# Altium footprint library BMS_Slave.PcbLib: 58 footprints (part 4 of 4)
Each footprint in its own frame and in the unit in brackets; x right, y up, seen from the top. Pads: shape width x height; smd on the part's side, far side on the other; paste and mask are expansions set on the pad; w line width, h text height; cw(c..) or ccw(c..) is an arc to the next point about the centre after c.
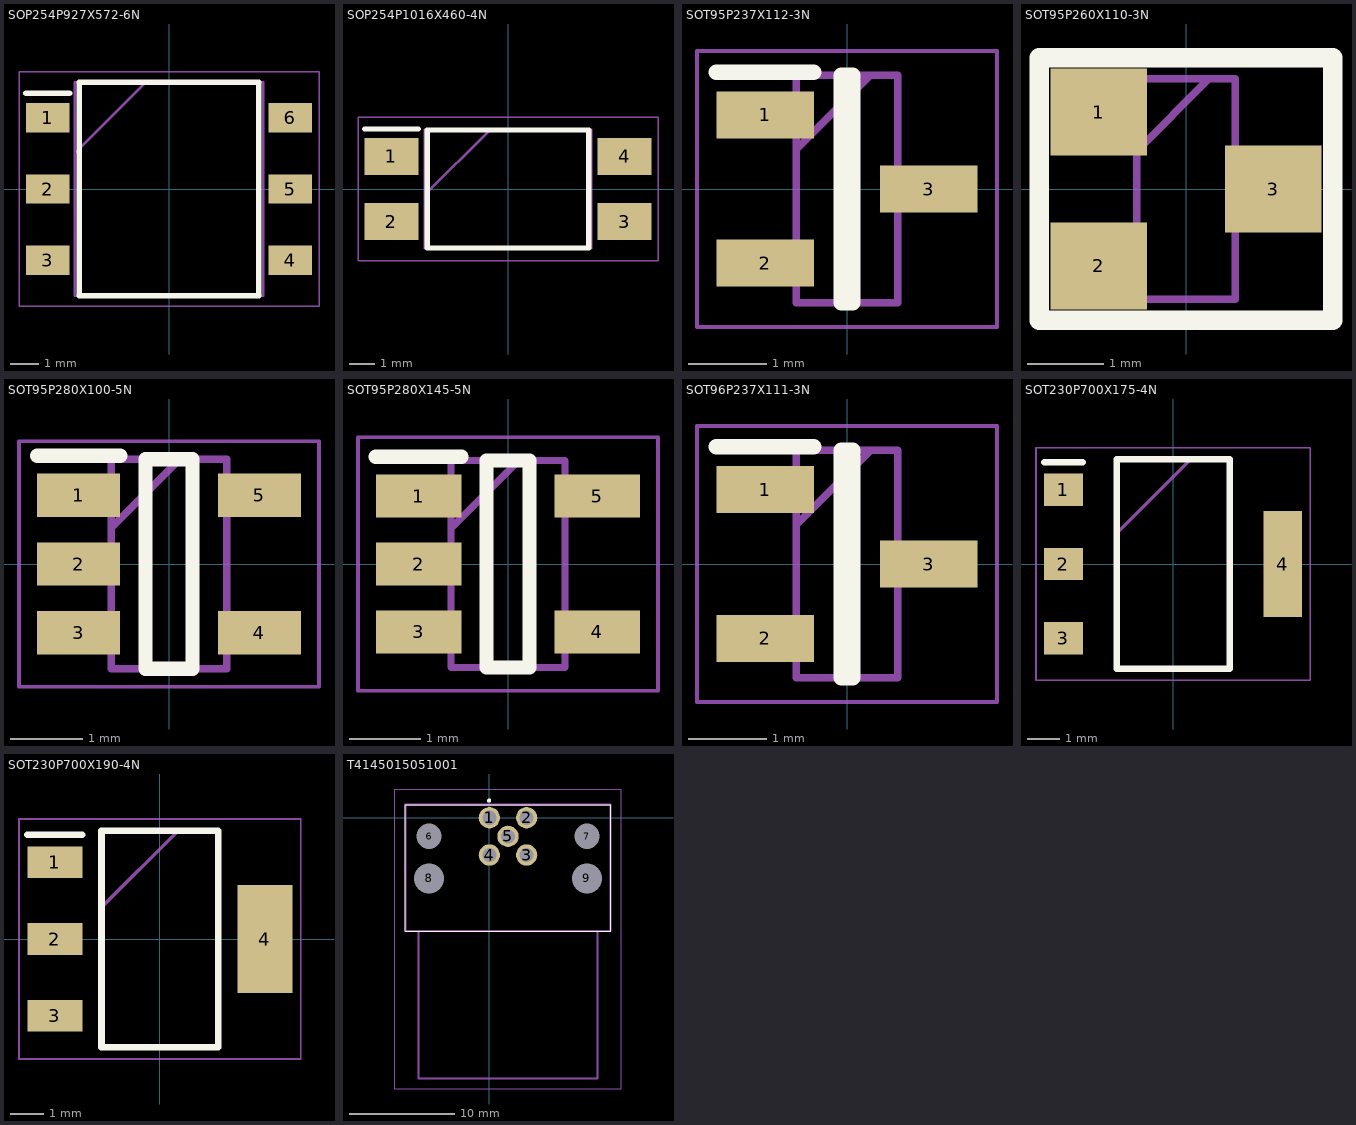
[diagram p3: the footprints below, top view; thin cyan lines are the x and y axes]

## SOP254P927X572-6N [mm]
pads (6):
  rect 1.55x1.05 smd: 1(-4.325,2.54) 2(-4.325,0) 3(-4.325,-2.54) 4(4.325,-2.54) 5(4.325,0) 6(4.325,2.54)
Top Overlay:
  lines w0.2: -5.1,3.415 -3.55,3.415 ; -3.2,-3.81 3.2,-3.81 3.2,3.81 -3.2,3.81 -3.2,-3.81
Mechanical 13:
  lines w0.1: -3.365,1.27 -0.825,3.81 ; -3.365,-3.81 3.365,-3.81 3.365,3.81 -3.365,3.81 -3.365,-3.81
Mechanical 15:
  lines w0.05: -5.35,-4.185 5.35,-4.185 5.35,4.185 -5.35,4.185 -5.35,-4.185
3D body "SM91502ALE.stp": height 5.72, standoff 0, extent -4.635,-3.81 4.635,3.81

## SOP254P1016X460-4N [mm]
pads (4):
  rect 2.1x1.45 smd: 1(-4.55,1.27) 2(-4.55,-1.27) 3(4.55,-1.27) 4(4.55,1.27)
Top Overlay:
  lines w0.2: -5.6,2.345 -3.5,2.345 ; -3.15,-2.3 3.15,-2.3 3.15,2.3 -3.15,2.3 -3.15,-2.3
Mechanical 13:
  lines w0.1: -3.25,-0.24 -0.71,2.3 ; -3.25,-2.3 3.25,-2.3 3.25,2.3 -3.25,2.3 -3.25,-2.3
Mechanical 15:
  lines w0.05: -5.85,-2.8 5.85,-2.8 5.85,2.8 -5.85,2.8 -5.85,-2.8
3D body "LTV-817S.stp": height 4.6, standoff 0, extent -5.08,-2.3 5.08,2.3

## SOT95P237X112-3N [mm]
pads (3):
  rect 1.25x0.6 smd: 1(-1.05,0.95) 2(-1.05,-0.95) 3(1.05,0)
Top Overlay:
  lines w0.2: -1.675,1.5 -0.425,1.5 ; -0.075,-1.46 0.075,-1.46 0.075,1.46 -0.075,1.46 -0.075,-1.46
Mechanical 13:
  lines w0.1: -0.65,0.51 0.3,1.46 ; -0.65,-1.46 0.65,-1.46 0.65,1.46 -0.65,1.46 -0.65,-1.46
Mechanical 15:
  lines w0.05: -1.925,-1.77 1.925,-1.77 1.925,1.77 -1.925,1.77 -1.925,-1.77
3D body "ATL431BQDBZR.stp": height 1.12, standoff 0, extent -1.185,-1.46 1.185,1.46

## SOT95P260X110-3N [mm]
pads (3):
  rect 1.27x1.143 smd: 1(-1.15,1.014) 2(-1.15,-1.014) 3(1.15,0)
Top Overlay:
  lines w0.254: -1.93,-1.727 -1.93,1.727 1.93,1.727 1.93,-1.727 -1.93,-1.727
Mechanical 13:
  lines w0.1: -0.65,0.5 0.3,1.45 ; -0.65,-1.45 -0.65,1.45 0.65,1.45 0.65,-1.45 -0.65,-1.45
Mechanical 15:
  lines w0.05: -1.975,-1.75 -1.975,1.75 1.975,1.75 1.975,-1.75 -1.975,-1.75
3D body "BSS308PE_H6327.stp": height 1.1, standoff 0, extent -1.3,-1.45 1.3,1.45

## SOT95P280X100-5N [mm]
pads (5):
  rect 1.15x0.6 smd: 1(-1.25,0.95) 2(-1.25,0) 3(-1.25,-0.95) 4(1.25,-0.95) 5(1.25,0.95)
Top Overlay:
  lines w0.2: -1.825,1.5 -0.675,1.5 ; -0.325,-1.45 -0.325,1.45 0.325,1.45 0.325,-1.45 -0.325,-1.45
Mechanical 13:
  lines w0.1: -0.8,0.5 0.15,1.45 ; -0.8,-1.45 -0.8,1.45 0.8,1.45 0.8,-1.45 -0.8,-1.45
Mechanical 15:
  lines w0.05: -2.075,-1.7 -2.075,1.7 2.075,1.7 2.075,-1.7 -2.075,-1.7
3D body "ADP160AUJZ-3.3-R7.stp": height 1, standoff 0, extent -1.4,-1.45 1.4,1.45

## SOT95P280X145-5N [mm]
pads (5):
  rect 1.2x0.6 smd: 1(-1.25,0.95) 2(-1.25,0) 3(-1.25,-0.95) 4(1.25,-0.95) 5(1.25,0.95)
Top Overlay:
  lines w0.2: -1.85,1.5 -0.65,1.5 ; -0.3,-1.45 0.3,-1.45 0.3,1.45 -0.3,1.45 -0.3,-1.45
Mechanical 13:
  lines w0.1: -0.8,0.5 0.15,1.45 ; -0.8,-1.45 0.8,-1.45 0.8,1.45 -0.8,1.45 -0.8,-1.45
Mechanical 15:
  lines w0.05: -2.1,-1.775 2.1,-1.775 2.1,1.775 -2.1,1.775 -2.1,-1.775
3D body "TLV1701QDBVRQ1.stp": height 1.45, standoff 0, extent -1.4,-1.45 1.4,1.45

## SOT96P237X111-3N [mm]
pads (3):
  rect 1.25x0.6 smd: 1(-1.05,0.955) 2(-1.05,-0.955) 3(1.05,0)
Top Overlay:
  lines w0.2: -1.675,1.505 -0.425,1.505 ; -0.075,-1.46 0.075,-1.46 0.075,1.46 -0.075,1.46 -0.075,-1.46
Mechanical 13:
  lines w0.1: -0.65,0.505 0.305,1.46 ; -0.65,-1.46 0.65,-1.46 0.65,1.46 -0.65,1.46 -0.65,-1.46
Mechanical 15:
  lines w0.05: -1.925,-1.77 1.925,-1.77 1.925,1.77 -1.925,1.77 -1.925,-1.77
3D body "SZNUP3105LT1G.stp": height 1.11, standoff 0, extent -1.185,-1.46 1.185,1.46

## SOT230P700X175-4N [mm]
pads (4):
  rect 1.2x1 smd: 1(-3.4,2.3) 2(-3.4,0) 3(-3.4,-2.3)
  rect 1.2x3.3 smd: 4(3.4,0)
Top Overlay:
  lines w0.2: -4,3.15 -2.8,3.15 ; -1.75,-3.25 -1.75,3.25 1.75,3.25 1.75,-3.25 -1.75,-3.25
Mechanical 13:
  lines w0.1: -1.75,0.95 0.55,3.25 ; -1.75,-3.25 -1.75,3.25 1.75,3.25 1.75,-3.25 -1.75,-3.25
Mechanical 15:
  lines w0.05: -4.25,-3.6 -4.25,3.6 4.25,3.6 4.25,-3.6 -4.25,-3.6
3D body "NSV1C201MZ4T1G.stp": height 1.75, standoff 0, extent -3.5,-3.25 3.5,3.25

## SOT230P700X190-4N [mm]
pads (4):
  rect 1.65x0.95 smd: 1(-3.15,2.3) 2(-3.15,0) 3(-3.15,-2.3)
  rect 1.65x3.25 smd: 4(3.15,0)
Top Overlay:
  lines w0.2: -3.975,3.125 -2.325,3.125 ; -1.75,-3.25 1.75,-3.25 1.75,3.25 -1.75,3.25 -1.75,-3.25
Mechanical 13:
  lines w0.1: -1.75,0.95 0.55,3.25 ; -1.75,-3.25 1.75,-3.25 1.75,3.25 -1.75,3.25 -1.75,-3.25
Mechanical 15:
  lines w0.05: -4.225,-3.6 4.225,-3.6 4.225,3.6 -4.225,3.6 -4.225,-3.6
3D body "LD1117S50TR.stp": height 1.9, standoff 0, extent -3.5,-3.25 3.5,3.25

## T4145015051001 [mm]
pads (9):
  round 2.025 hole 1.35: 1(0,0) 2(3.54,0) 3(3.54,-3.54) 4(0,-3.54) 5(1.77,-1.77)
  round 1.2 hole 2.4 unplated: 6(-5.73,-1.77) 7(9.27,-1.77)
  round 1.425 hole 2.85 unplated: 8(-5.73,-5.77) 9(9.27,-5.77)
Top Overlay:
  lines w0.1: -7.98,-10.77 -7.98,1.23 11.52,1.23 11.52,-10.77 -7.98,-10.77
  lines w0.2: -0.13,1.63 ccw(c-0.03,1.63) 0.07,1.63 ccw(c-0.03,1.63) -0.13,1.63
Mechanical 13:
  lines w0.2: -6.73,-10.77 -6.73,-24.77 10.27,-24.77 10.27,-10.77 ; -7.98,-10.77 -7.98,1.23 11.52,1.23 11.52,-10.77 -7.98,-10.77
Mechanical 15:
  lines w0.1: -8.98,-25.77 -8.98,2.73 12.52,2.73 12.52,-25.77 -8.98,-25.77
3D body "T4145015041-001.stp": height 0, standoff -26, extent -9.75,-12.1 9.75,7.5